# Altium schematic symbol library AD_Lib.SchLib: 1239 symbols (part 6 of 9)
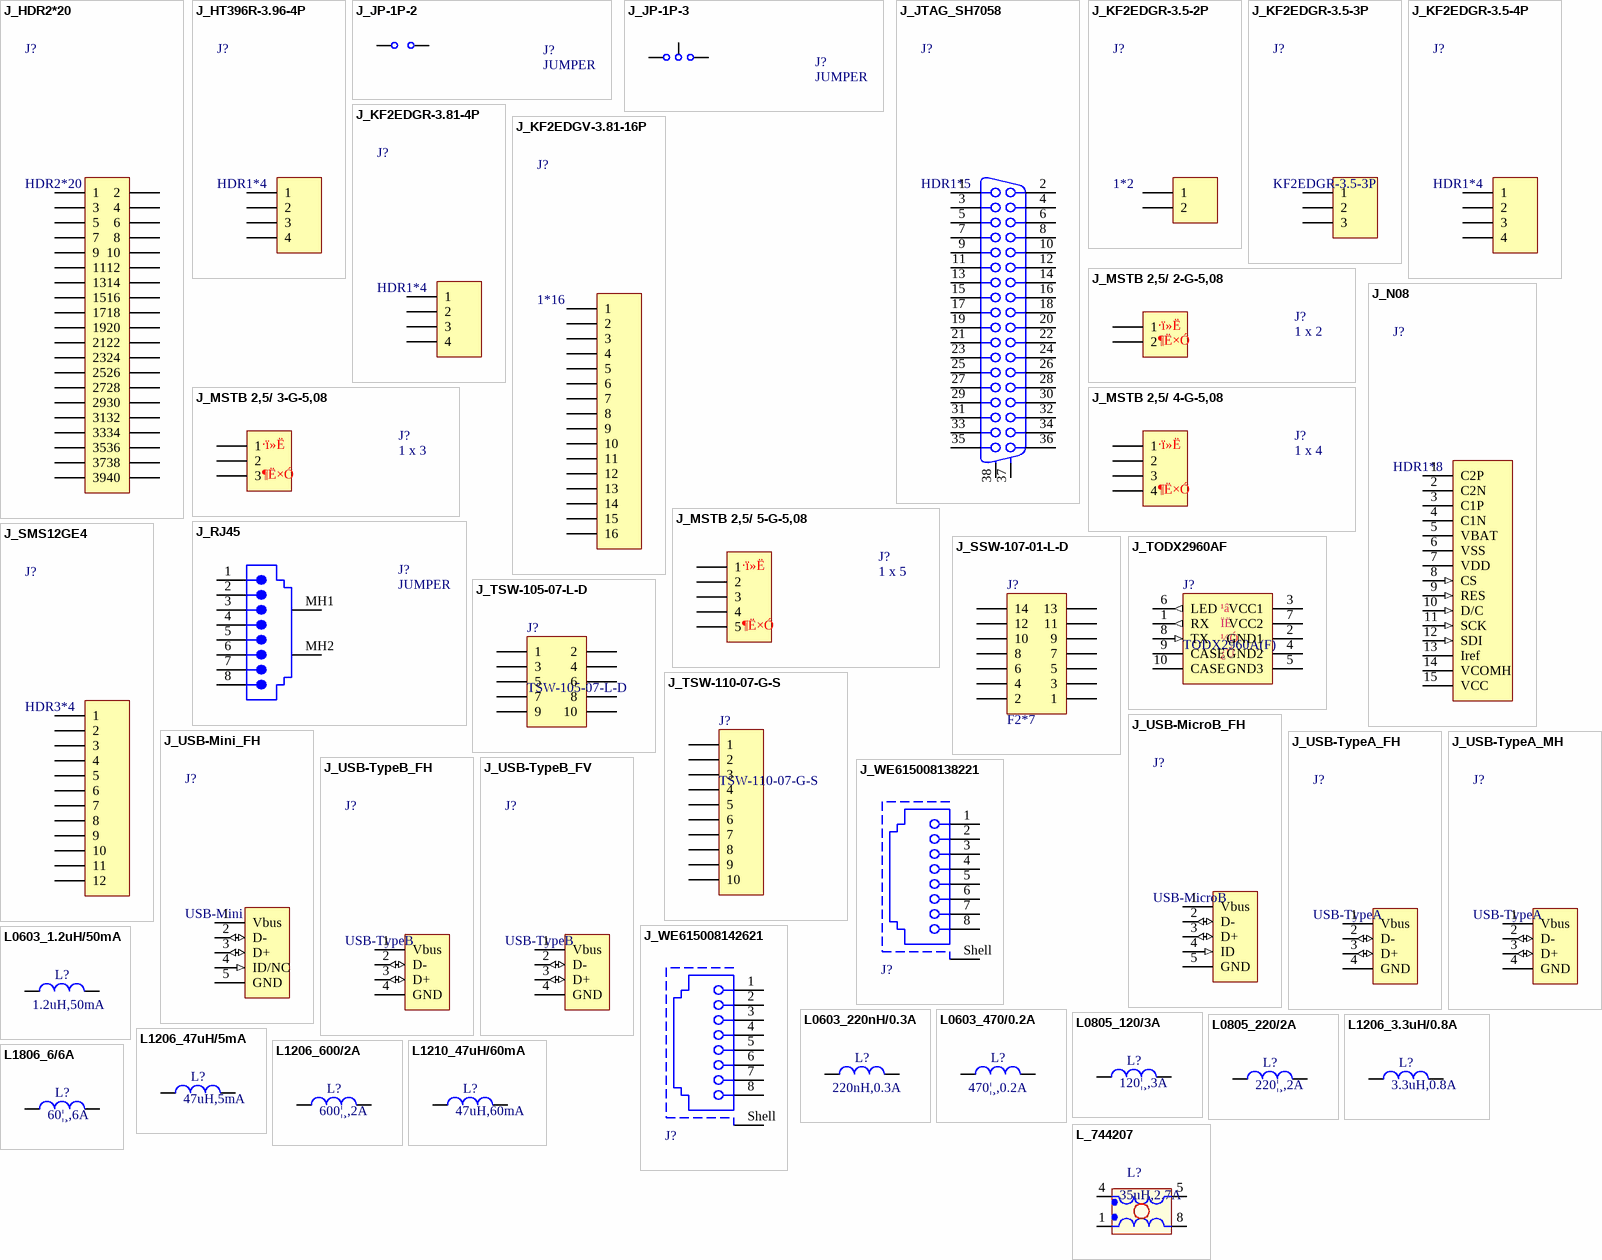
[diagram p47: symbols J_HDR2*20 to L_744207]

## J_USB-TypeB_FH
designator J?, comment USB-TypeB
USB; Type B; Female; Angle; Manufacturer: TE; Quality: -30~80¡ãC; pro-environment: RoHS; Value: USB,Type B, Female; OPN: 292304-1; PadsNum: 0; other: USB; Type B; Female; Angle; SN: SN; Category: Á¬½ÓÆ÷; Part: USB-TypeB; QTY: 100; Price: 1.61; OPN_JLC: 921-111A1010D10200; SN_JLC: C46392; Price_JLC: 0.519005
footprint J_USB-TypeB_FH (Footprint not found)
pins: 1 Vbus (power), 2 D- (io), 3 D+ (io), 4 GND (power)

## J_USB-TypeB_FV
designator J?, comment USB-TypeB
USB; Type B; Female; Vertical; Manufacturer: ¾«ÍØ½ð; Quality: -30~80¡ãC; pro-environment: RoHS; Value: USB,Type B, Female; PadsNum: 0; other: USB; Type B; Female; Vertical; SN: SN; Category: Á¬½ÓÆ÷; OPN: -; Part: USB-TypeB; QTY: 100; Price: -; OPN_JLC: 921-111A1010Y10200; SN_JLC: C26234; Price_JLC: 0.7224
footprint J_USB-TypeB_FV (USB - Type B£¬Ä¸×ù£¬´¹Ö±°²×°£»921-111A1010Y10200£¨C26234£©)
pins: 1 Vbus (power), 2 D- (io), 3 D+ (io), 4 GND (power)

## J_WE615008138221
designator J?, comment 615008138221  (value not drawn)
WR-MJ Modular Jack THT Vertical Shielded 8P8C Front Post; Manufacturer: Wurth Elektronik; Contact Resistance: 20mOhm; Insulation Resistance: 500MOhm; LED: No; Number of Ports: 1; Rated Current: 1.5A; Shielding: Yes; Working Voltage: 120VAC; Withstanding Voltage: 1000VAC; ComponentLink1Description: Manufacturer Link; ComponentLink1URL: https://www.we-online.com/redexpert/article/615008138221?ad; ComponentLink2Description: Datasheet; ComponentLink2URL: https://www.we-online.com/redexpert/spec/615008138221?ad; Category: Input/Output Connectors; Match Code: WR-MJ; Manufacturer Part Number: 615008138221; Mount: Through Hole; Operating Temperature Max: 85°C; Operating Temperature Min: -40°C; Packaging: Tray; Number of Pins: 8P8C; Orientation: Vertical
footprint 615008138221
pins: 1, 2, 3, 4, 5, 6, 7, 8, Shell

## J_WE615008142621
designator J?, comment 615008142621  (value not drawn)
WR-MJ Modular Jack THT Horizontal Shielded Rear Grounding Post 8P8C Tab Down; Manufacturer: Wurth Elektronik; Contact Resistance: 20mOhm; Insulation Resistance: 500MOhm; LED: No; Number of Ports: 1; Rated Current: 1.5A; Shielding: Yes; Working Voltage: 120VAC; Withstanding Voltage: 1000VAC; ComponentLink1Description: Manufacturer Link; ComponentLink1URL: https://www.we-online.com/redexpert/article/615008142621?ad; ComponentLink2Description: Datasheet; ComponentLink2URL: https://www.we-online.com/redexpert/spec/615008142621?ad; Category: Input/Output Connectors; Match Code: WR-MJ; Manufacturer Part Number: 615008142621; Mount: Through Hole; Operating Temperature Max: 85°C; Operating Temperature Min: -40°C; Packaging: Tray; Number of Pins: 8P8C; Orientation: Horizontal
footprint 615008142621
pins: 1, 2, 3, 4, 5, 6, 7, 8, Shell

## L0603_1.2uH/50mA
designator L?, comment 1.2uH,50mA
ÌùÆ¬µç¸Ð; Manufacturer: TDK; Quality: -55~125¡æ; pro-environment: RoHS; OPN: MLF1608A1R2KTA00; PadsNum: 0; SN: SN; Category: µç¸Ð; Part: MLF1608A1R2KTA00; QTY: 4000; Price: 0.46895; OPN_JLC: OPN_JLC; SN_JLC: SN_JLC; Value: 1.2uH,50mA; Price_JLC: 0
footprint L0603 (Footprint not found)
pins: 1, 2

## L0603_220nH/0.3A
designator L?, comment 220nH,0.3A
ÌùÆ¬µç¸Ð; Manufacturer: Johanson Technology Inc.; Quality: -40~100¡æ; pro-environment: RoHS; OPN: L-14CR22JV4T; PadsNum: 0; SN: SN; Category: µç¸Ð; Part: L-14CR22JV4T; QTY: 4000; Price: 0.16965; OPN_JLC: OPN_JLC; SN_JLC: SN_JLC; Value: 220nH,0.3A; Price_JLC: 0
footprint L0603 (Footprint not found)
pins: 1, 2

## L0603_470/0.2A
designator L?, comment value 470¦¸,0.2A  (hidden comment: BLM18RK471SN1D)
ÌùÆ¬´ÅÖé; Manufacturer: Murata; Quality: -55~120¡æ; SN: 03.4.32.30.16047101S; pro-environment: RoHS; PadsNum: 0; Category: µç¸Ð; OPN: BLM18RK471SN1D; Part: BLM18RK471SN1D; QTY: 4000; Price: 0.16965; OPN_JLC: OPN_JLC; SN_JLC: SN_JLC; Price_JLC: 0
footprint L0603 (Footprint not found)
pins: 1, 2

## L0805_120/3A
designator L?, comment 120¦¸,3A
ÌùÆ¬´ÅÖé; Manufacturer: ·ç»ª¸ß¿Æ; Quality: -55~80¡æ; SN: 03.4.32.28.17012101S; pro-environment: RoHS; OPN: CBW201209U121T; PadsNum: 0; Category: µç¸Ð; Part: CBW201209U121T; Value: 120¦¸,3A; Price: ?; OPN_JLC: GZ2012D101TF; SN_JLC: C1015; Price_JLC: 0
footprint L0805 (ÌùÆ¬´ÅÖé)
pins: 1, 2

## L0805_220/2A
designator L?, comment 220¦¸,2A
ÌùÆ¬´ÅÖé; Manufacturer: Murata; Quality: -55~125¡æ; pro-environment: RoHS; OPN: BLM21PG221SN1D; PadsNum: 2; SN: SN; Category: µç¸Ð; Part: BLM21PG221SN1D; Value: 220¦¸,2A; QTY: 4000; Price: 0.18486; OPN_JLC: BLM21PG221SN1D; SN_JLC: C85840; Price_JLC: 0.163828
footprint L0805 (ÌùÆ¬´ÅÖé)
pins: 1, 2

## L1206_3.3uH/0.8A
designator L?, comment 3.3uH,0.8A
ÌùÆ¬µç¸Ð; 3.3uH; 0.8A; 0.3¦¸;; Manufacturer: Murata; Quality: -55~125¡æ; pro-environment: RoHS; OPN: LQM31PN3R3M00L; PadsNum: 2; SN: SN; Category: µç¸Ð; Part: LQM31PN3R3M00L; Value: 3.3uH,0.8A; QTY: 3000; Price: 0.58; OPN_JLC: LQM31PN3R3M00L; SN_JLC: C91612; Price_JLC: 0.58
footprint L1206 (¹«ÖÆ3216£»Ó¢ÖÆ1206£»¹¦ÂÊ1/4W)
pins: 1, 2

## L1206_47uH/5mA
designator L?, comment 47uH,5mA
ÌùÆ¬µç¸Ð; 47uH; 5mA; 3.4¦¸;; Manufacturer: Sunltech; Quality: -55~125¡æ; pro-environment: RoHS; OPN: SCL3216T470KSP; PadsNum: 2; SN: SN; Category: µç¸Ð; Part: SCL3216T470KSP; Value: 47uH,5mA; QTY: 3000; Price: 0.172711; OPN_JLC: CMI321611J470KT; SN_JLC: C75660; Price_JLC: 0.137879
footprint L1206 (¹«ÖÆ3216£»Ó¢ÖÆ1206£»¹¦ÂÊ1/4W)
pins: 1, 2

## L1206_600/2A
designator L?, comment 600¦¸,2A
ÌùÆ¬´ÅÖé; Manufacturer: Wurth; Quality: -55~125¡æ; pro-environment: RoHS; OPN: 74279218; PadsNum: 2; SN: SN; Category: µç¸Ð; Part: 74279218; Value: 600¦¸,2A; QTY: 3000; Price: 1.2519; OPN_JLC: SCBG321609U601T; SN_JLC: C480914; Price_JLC: 0.048322
footprint L1206 (¹«ÖÆ3216£»Ó¢ÖÆ1206£»¹¦ÂÊ1/4W)
pins: 1, 2

## L1210_47uH/60mA
designator L?, comment 47uH,60mA
ÌùÆ¬µç¸Ð; 47uH; 60mA; 7¦¸;; Manufacturer: TDK; Quality: -55~125¡æ; pro-environment: RoHS; OPN: NLV32T-470J-PF; PadsNum: 2; SN: SN; Category: µç¸Ð; Part: NLV32T-470J-PF; Value: 47uH,60mA; QTY: 2000; Price: 0.188443; OPN_JLC: NLV32T-470J-PF; SN_JLC: C66936; Price_JLC: 0.188443
footprint L1210 (Footprint not found)
pins: 1, 2

## L1806_6/6A
designator L?, comment 60¦¸,6A
ÌùÆ¬´ÅÖé; Manufacturer: Murata; Quality: -55~125¡æ; pro-environment: RoHS; OPN: BLM41PG600SN1L; PadsNum: 0; SN: SN; Category: µç¸Ð; Part: BLM41PG600SN1L; Value: 60¦¸,6A; QTY: 2500; Price: 1.03734; OPN_JLC: OPN_JLC; SN_JLC: SN_JLC; Price_JLC: 0
footprint L1806 (Footprint not found)
pins: 1, 2

## L_744207
designator L?, comment 35uH,2.7A
¹²Ä£µç¸Ð; 35uH; 2.7A; Manufacturer: Wurth; Quality: -40~85¡æ; SN: 03.4.32.37.99420701S; pro-environment: RoHS; other: 35uH;2.7A;0.035¦¸; OPN: 744207; PadsNum: 0; Part: 744207; Category: µç¸Ð; Value: 35uH,2.7A; QTY: 1000; Price: ?; OPN_JLC: OPN_JLC; SN_JLC: SN_JLC; Price_JLC: 0
footprint 744207 (Footprint not found)
pins: 1, 4, 5, 8

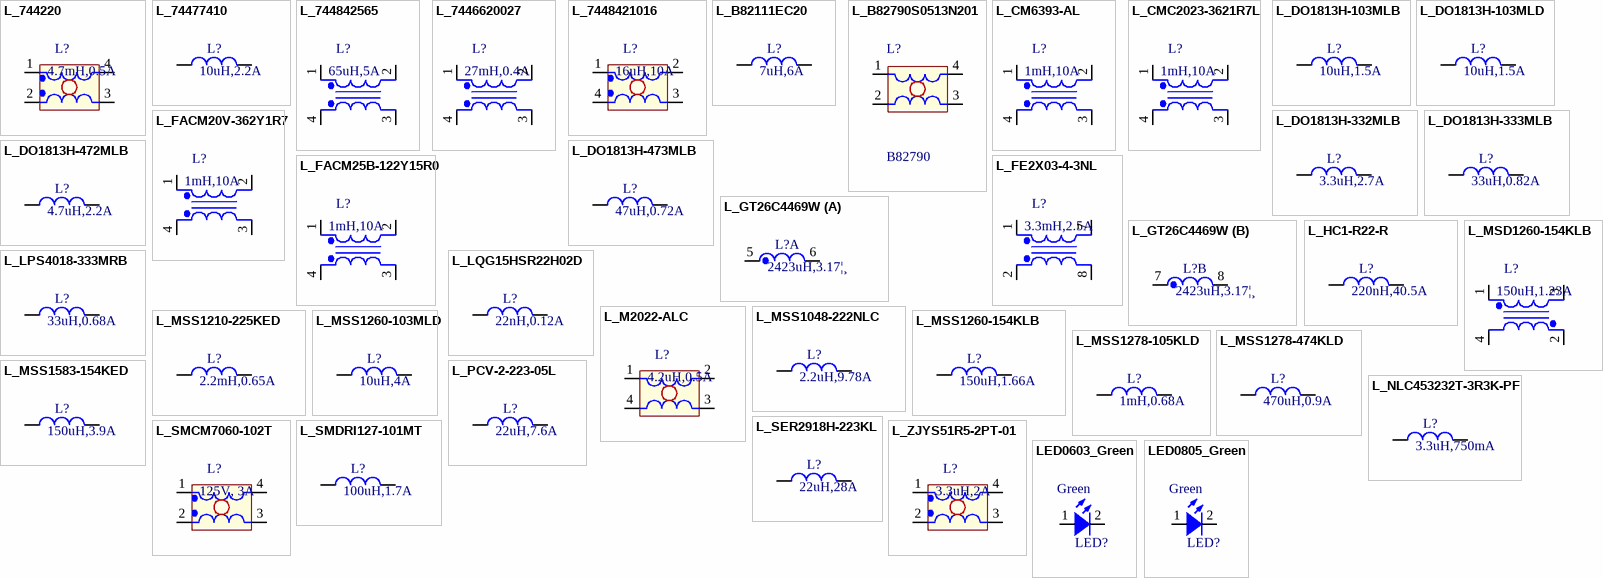
[diagram p25: symbols L_744220 to LED0805_Green]

## L_744220
designator L?, comment 4.7mH,0.5A
¹²Ä£µç¸Ð;4.7mH;0.5A; Manufacturer: Wurth; Quality: -25~125¡æ; SN: 03.4.32.23.99422001S; pro-environment: RoHS; other: 0.5A;0.75¦¸;4.7mH; OPN: 744220; PadsNum: 0; Part: 744220; Category: µç¸Ð; Value: 4.7mH,0.5A; QTY: 1000; Price: 15.0111; OPN_JLC: OPN_JLC; SN_JLC: SN_JLC; Price_JLC: 0
footprint L_744220 (WuthÖ®¹²Ä£µç¸Ð)
pins: 1, 2, 3, 4

## L_74477410
designator L?, comment 10uH,2.2A
µç¸Ð;10uH;2.2A; Manufacturer: Wurth; Quality: -40~85¡æ; SN: 03.4.32.23.99741001S; pro-environment: RoHS; OPN: 74477410; PadsNum: 0; Category: µç¸Ð; Part: 74477410; Value: 10uH,2.2A; QTY: 1500; Price: 10.4247; OPN_JLC: OPN_JLC; SN_JLC: SN_JLC; Price_JLC: 0
footprint WE_PD2 (Footprint not found)
pins: 1, 2

## L_744842565
designator L?, comment 65uH,5A
¹²Ä£µç¸Ð;65uH;5A; Manufacturer: Wurth; Quality: -25~125¡æ; pro-environment: RoHS; other: 5A,13m¦¸; OPN: 744842565; PadsNum: 0; SN: SN; Part: 744842565; Category: µç¸Ð; Value: 65uH,5A; QTY: 80; Price: ?; OPN_JLC: OPN_JLC; SN_JLC: SN_JLC; Price_JLC: 0
footprint L_744842565 (Wurth¹²Ä£µç¸Ð)
pins: 1, 2, 3, 4

## L_7446620027
designator L?, comment 27mH,0.4A
¹²Ä£µç¸Ð;27mH;0.4A; Manufacturer: Wurth; Quality: -25~125¡æ; SN: 03.4.32.23.99744601S; pro-environment: RoHS; other: 0.4A;1.2¦¸;27mH; OPN: 7446620027; PadsNum: 0; Part: 7446620027; Category: µç¸Ð; Value: 27mH,0.4A; QTY: 90; Price: 30.7242; OPN_JLC: OPN_JLC; SN_JLC: SN_JLC; Price_JLC: 0
footprint L_7446620027 (Wurth¹²Ä£µç¸Ð)
pins: 1, 2, 3, 4

## L_7448421016
designator L?, comment 16uH,10A
¹²Ä£µç¸Ð;16uH;10A; Manufacturer: Wurth; Quality: -25~125¡æ; SN: 03.4.32.37.99101601S; pro-environment: RoHS; other: 10A;3m¦¸;16uH; OPN: 7448421016; PadsNum: 0; Part: 7448421016; Category: µç¸Ð; Value: 16uH,10A; QTY: 80; Price: 54.1359; OPN_JLC: OPN_JLC; SN_JLC: SN_JLC; Price_JLC: 0
footprint L_7448421016 (Wurth¹²Ä£µç¸Ð)
pins: 1, 2, 3, 4

## L_B82111EC20
designator L?, comment 7uH,6A
µç¸Ð; Manufacturer: TDK; Part: B82111EC20; Quality: -55~125¡æ; pro-environment: RoHS; OPN: B82111E0000C020; other: 7uH;6A;Rdc=20m¦¸;fr=180 MHz;10%; PadsNum: 0; SN: SN; Category: µç¸Ð; Value: 7uH,6A; QTY: 1000; Price: 4.9608; OPN_JLC: OPN_JLC; SN_JLC: SN_JLC; Price_JLC: 0
footprint L_B82111E (Footprint not found)
pins: 1, 2

## L_B82790S0513N201
designator L?, comment B82790
¹²Ä£µç¸Ð;51uH;0.5A; Manufacturer: EPCOS / TDK; pro-environment: RoHS; Quality: -40~85¡æ; SN: 03.4.32.37.99020101S; Value: 51uH,0.5A; other: 51uH,0.5A,0.14; OPN: B82790S0513N201; PadsNum: 0; Category: µç¸Ð; Part: B82790; QTY: 1500; Price: 11.1618; OPN_JLC: OPN_JLC; SN_JLC: SN_JLC; Price_JLC: 0
footprint L_B82790 (EPCOS¹²Ä£µç¸Ð)
pins: 1, 2, 3, 4

## L_CM6393-AL
designator L?, comment 1mH,10A
¹²Ä£µç¸Ð£¬¶¨ÖÆ; Manufacturer: ¶¨ÖÆ; Quality: -25~85¡æ; pro-environment: RoHS; OPN: CM6393-AL; PadsNum: 0; SN: SN; other: ¶¨ÖÆ; Part: CM6393-AL; Category: µç¸Ð; Value: 1mH,10A; QTY: 1; Price: ?; OPN_JLC: OPN_JLC; SN_JLC: SN_JLC; Price_JLC: 0
footprint L_CM6393-AL (¶¨ÖÆµç¸Ð)
pins: 1, 2, 3, 4

## L_CMC2023-3621R7L
designator L?, comment 1mH,10A
¹²Ä£µç¸Ð£¬¶¨ÖÆ; Manufacturer: ¶¨ÖÆ; Quality: -25~85¡æ; pro-environment: RoHS; OPN: CMC2023-3621R7L; PadsNum: 0; SN: SN; other: ¶¨ÖÆ; Part: CMC2023-3621R7L; Category: µç¸Ð; Value: 1mH,10A; QTY: 1; Price: ?; OPN_JLC: OPN_JLC; SN_JLC: SN_JLC; Price_JLC: 0
footprint L_CMC2023-3621R7L (¶¨ÖÆµç¸Ð)
pins: 1, 2, 3, 4

## L_DO1813H-103MLB
designator L?, comment 10uH,1.5A
µç¸Ð; Manufacturer: Coilcraft; Quality: -40~85¡æ; SN: 03.4.32.23.99010302S; pro-environment: RoHS; OPN: DO1813H-103MLB; PadsNum: 0; Category: µç¸Ð; Part: DO1813H-103MLB; Value: 10uH,1.5A; QTY: 750; Price: ?; OPN_JLC: OPN_JLC; SN_JLC: SN_JLC; Price_JLC: 0
footprint L_DO1813H (CoilcraftÖ®DO1813HÏµÁÐµç¸Ð.£¬ÈçDO1813H-103ML)
pins: 1, 2

## L_DO1813H-103MLD
designator L?, comment 10uH,1.5A
µç¸Ð; Manufacturer: Coilcraft; Quality: -40~85¡æ; pro-environment: RoHS; OPN: DO1813H-103MLD; PadsNum: 0; SN: SN; Category: µç¸Ð; Part: DO1813H-103MLD; Value: 10uH,1.5A; QTY: 1000; Price: 5.8968; OPN_JLC: OPN_JLC; SN_JLC: SN_JLC; Price_JLC: 0
footprint L_DO1813H (CoilcraftÖ®DO1813HÏµÁÐµç¸Ð.£¬ÈçDO1813H-103ML)
pins: 1, 2

## L_DO1813H-332MLB
designator L?, comment 3.3uH,2.7A
µç¸Ð; Manufacturer: Coilcraft; Quality: -40~85¡æ; SN: 03.4.32.23.99033201S; pro-environment: RoHS; OPN: DO1813H-332MLB; PadsNum: 0; Category: µç¸Ð; Part: DO1813H-332MLB; Value: 3.3uH,2.7A; QTY: 30; Price: ?; OPN_JLC: OPN_JLC; SN_JLC: SN_JLC; Price_JLC: 0
footprint L_DO1813H (CoilcraftÖ®DO1813HÏµÁÐµç¸Ð.£¬ÈçDO1813H-103ML)
pins: 1, 2

## L_DO1813H-333MLB
designator L?, comment 33uH,0.82A
µç¸Ð; Manufacturer: Coilcraft; Part: DO1813H-333ML; Quality: -40~85¡æ; pro-environment: RoHS; OPN: DO1813H-333MLB; other: 33uH,0.82A,20MHz,20%; PadsNum: 0; SN: SN; Category: µç¸Ð; Value: 33uH,0.82A; QTY: 1000; Price: ?; OPN_JLC: OPN_JLC; SN_JLC: SN_JLC; Price_JLC: 0
footprint L_DO1813H (CoilcraftÖ®DO1813HÏµÁÐµç¸Ð.£¬ÈçDO1813H-103ML)
pins: 1, 2

## L_DO1813H-472MLB
designator L?, comment 4.7uH,2.2A
µç¸Ð; Manufacturer: Coilcraft; Part: DO1813H-472ML; Quality: -40~85¡æ; SN: 03.4.32.23.99047202S; pro-environment: RoHS; OPN: DO1813H-472MLB; PadsNum: 0; Category: µç¸Ð; Value: 4.7uH,2.2A; QTY: 30; Price: ?; OPN_JLC: OPN_JLC; SN_JLC: SN_JLC; Price_JLC: 0
footprint L_DO1813H (CoilcraftÖ®DO1813HÏµÁÐµç¸Ð.£¬ÈçDO1813H-103ML)
pins: 1, 2

## L_DO1813H-473MLB
designator L?, comment 47uH,0.72A
µç¸Ð; Manufacturer: Coilcraft; Part: DO1813H-473ML; Quality: -40~85¡æ; SN: 03.4.32.23.99047301S; pro-environment: RoHS; OPN: DO1813H-473MLB; PadsNum: 0; Category: µç¸Ð; Value: 47uH,0.72A; QTY: 30; Price: 10.7055; OPN_JLC: OPN_JLC; SN_JLC: SN_JLC; Price_JLC: 0
footprint L_DO1813H (CoilcraftÖ®DO1813HÏµÁÐµç¸Ð.£¬ÈçDO1813H-103ML)
pins: 1, 2

## L_FACM20V-362Y1R7
designator L?, comment 1mH,10A
¹²Ä£µç¸Ð£¬¶¨ÖÆ; Manufacturer: ¶¨ÖÆ; Quality: -25~85¡æ; SN: 03.4.32.37.99M20V01S; pro-environment: RoHS; OPN: FACM20V-362Y1R7; PadsNum: 0; other: ¶¨ÖÆ; Part: FACM20V-362Y1R7; Category: µç¸Ð; Value: 1mH,10A; QTY: 1; Price: ?; OPN_JLC: OPN_JLC; SN_JLC: SN_JLC; Price_JLC: 0
footprint L_FACM20V-362Y1R7 (¶¨ÖÆµç¸Ð)
pins: 1, 2, 3, 4

## L_FACM25B-122Y15R0
designator L?, comment 1mH,10A
¹²Ä£µç¸Ð£¬¶¨ÖÆ; Manufacturer: ¶¨ÖÆ; Quality: -25~85¡æ; SN: 03.4.32.37.99M25B01S; pro-environment: RoHS; OPN: FACM25B-122Y15R0; PadsNum: 0; other: ¶¨ÖÆ; Part: FACM25B-122Y15R0; Category: µç¸Ð; Value: 1mH,10A; QTY: 1; Price: ?; OPN_JLC: OPN_JLC; SN_JLC: SN_JLC; Price_JLC: 0
footprint L_FACM25B-122Y15R0 (¶¨ÖÆµç¸Ð)
pins: 1, 2, 3, 4

## L_FE2X03-4-3NL
designator L?, comment 3.3mH,2.5A
¹²Ä£µç¸Ð;3.3mH;2.5A; Manufacturer: Pulse; Quality: 0~60¡æ; pro-environment: RoHS; other: 3.3mH,2.5A,700m¦¸; OPN: FE2X03-4-3NL; PadsNum: 0; SN: SN; Part: FE2X03-4-3NL; Category: µç¸Ð; Value: 3.3mH,2.5A; QTY: 20; Price: 25.3539; OPN_JLC: OPN_JLC; SN_JLC: SN_JLC; Price_JLC: 0
footprint L_744842565 (Wurth¹²Ä£µç¸Ð)
pins: 1, 2, 7, 8

## L_GT26C4469W
designator L?, comment 2423uH,3.17¦¸
µç¸Ð; Manufacturer: ²©¶à; Quality: -40~85¡æ; pro-environment: RoHS; OPN: GT26C4469W; PadsNum: 0; SN: SN; Category: µç¸Ð; Part: GT26C4469W; Value: 2423uH,3.17¦¸; QTY: 1; Price: ?; OPN_JLC: OPN_JLC; SN_JLC: SN_JLC; Price_JLC: 0
footprint L_GT26C4469W (¶¨ÖÆµç¸Ð)
part A pins: 5, 6
part B pins: 7, 8

## L_HC1-R22-R
designator L?, comment 220nH,40.5A
µç¸Ð;220nH;40.5A;360m¦¸; Manufacturer: Eaton; Quality: -40~105¡æ; pro-environment: RoHS; OPN: HC1-R22-R; other: 220nH,40.5A,360m¦¸; PadsNum: 0; SN: SN; Category: µç¸Ð; Part: HC1-R22-R; Value: 220nH,40.5A; QTY: 250; Price: 19.0359; OPN_JLC: OPN_JLC; SN_JLC: SN_JLC; Price_JLC: 0
footprint L_HC1 (Footprint not found)
pins: 1, 2

## L_LPS4018-333MRB
designator L?, comment 33uH,0.68A
ÌùÆ¬µç¸Ð; 33uH; 0.68A; 0.42¦¸;; Manufacturer: Coilcraft; Quality: -55~125¡æ; pro-environment: RoHS; OPN: LPS4018-333MRB; PadsNum: 2; SN: SN; Category: µç¸Ð; Part: LPS4018-333MRB; Value: 33uH,0.68A; QTY: 3000; Price: 4.2488; OPN_JLC: ASPI-0315S-330M-T; SN_JLC: C187268; Price_JLC: 2.13
footprint L_LPS4018 (CoilcraftÖ®LPS4018ÏµÁÐµç¸Ð.£¬ÈçLPS4018-333MRB)
pins: 1, 2

## L_LQG15HSR22H02D
designator L?, comment 22nH,0.12A
µç¸Ð; 22nH; 0.12A; 3.77¦¸; Manufacturer: Murata; Quality: -40~85¡æ; pro-environment: RoHS; OPN: LQG15HSR22H02D; PadsNum: 0; SN: SN; Category: µç¸Ð; Part: LQG15HSR22H02D; Value: 22nH,0.12A; QTY: 10000; Price: 0.18369; OPN_JLC: OPN_JLC; SN_JLC: SN_JLC; Price_JLC: 0
footprint L0402 (Footprint not found)
pins: 1, 2

## L_M2022-ALC
designator L?, comment 4.2uH,0.5A
¹²Ä£µç¸Ð;4.2uH,0.5A; Manufacturer: Coilcraft; Part: M2022; Quality: -25~125¡æ; SN: 03.4.32.37.99202201S; pro-environment: RoHS; other: 4.2uH,0.5A,800m¦¸; OPN: M2022-ALC; PadsNum: 0; Category: µç¸Ð; Value: 4.2uH,0.5A; QTY: 600; Price: 9.3132; OPN_JLC: OPN_JLC; SN_JLC: SN_JLC; Price_JLC: 0
footprint L_M2022 (Footprint not found)
pins: 1, 2, 3, 4

## L_MSD1260-154KLB
designator L?, comment 150uH,1.23A
ñîºÏµç¸Ð; 150uH; 1.23A; 476m¦¸; Manufacturer: Coilcraft; Part: MSD1260-154; Quality: -40~85¡æ; SN: 03.4.32.23.99015401S; pro-environment: RoHS; other: 1.23A,476m¦¸; OPN: MSD1260-154KLB; PadsNum: 0; Category: µç¸Ð; Value: 150uH,1.23A; QTY: 1; Price: 16.9299; OPN_JLC: OPN_JLC; SN_JLC: SN_JLC; Price_JLC: 0
footprint L_MSD1260 (CoilcraftÖ®MSD1260ÏµÁÐñîºÏµç¸Ð)
pins: 1, 2, 3, 4

## L_MSS1048-222NLC
designator L?, comment 2.2uH,9.78A
µç¸Ð; 2.2uH; 9.78A; 7.2 ¦¸; Manufacturer: Coilcraft; Part: MSS1048-222; Quality: -40~85¡æ; SN: 03.4.32.23.99022201S; pro-environment: RoHS; OPN: MSS1048-222NLC; other: 2.2uH,9.78A,7.2 ¦¸; PadsNum: 0; Category: µç¸Ð; Value: 2.2uH,9.78A; QTY: 200; Price: 8.7282; OPN_JLC: OPN_JLC; SN_JLC: SN_JLC; Price_JLC: 0
footprint L_MSS1048 (Footprint not found)
pins: 1, 2

## L_MSS1210-225KED
designator L?, comment 2.2mH,0.65A
µç¸Ð; 2.2mH; 0.65A; 2.2 ¦¸; Manufacturer: Coilcraft; Part: MSS1210-225; Quality: -40~85¡æ; SN: 03.4.32.28.19225K01S; pro-environment: RoHS; OPN: MSS1210-225KED; PadsNum: 0; Category: µç¸Ð; Value: 2.2mH,0.65A; QTY: 300; Price: 11.1618; OPN_JLC: OPN_JLC; SN_JLC: SN_JLC; Price_JLC: 0
footprint L_MSS1210 (CoilcraftÖ®MSS1210ÏµÁÐ£¬MSS1210-225KED)
pins: 1, 2

## L_MSS1260-103MLD
designator L?, comment 10uH,4A
µç¸Ð; 10uH; 4A; 23.9m¦¸; Manufacturer: Coilcraft; Part: MSS1260-103; Quality: -40~85¡æ; SN: 03.4.32.23.99010305S; pro-environment: RoHS; other: 4A,23.9m¦¸,10uH,20%; OPN: MSS1260-103MLD; PadsNum: 0; Category: µç¸Ð; Value: 10uH,4A; QTY: 500; Price: 8.9271; OPN_JLC: OPN_JLC; SN_JLC: SN_JLC; Price_JLC: 0
footprint L_MSD1260 (CoilcraftÖ®MSD1260ÏµÁÐñîºÏµç¸Ð)
pins: 1, 2

## L_MSS1260-154KLB
designator L?, comment 150uH,1.66A
µç¸Ð; 10uH; 4A; 23.9m¦¸; Manufacturer: Coilcraft; Part: MSS1260-154; Quality: -40~85¡æ; pro-environment: RoHS; other: 150uH,1.66A,216m¦¸,10%; OPN: MSS1260-154KLB; PadsNum: 0; SN: SN; Category: µç¸Ð; Value: 150uH,1.66A; QTY: 1; Price: 15.8535; OPN_JLC: OPN_JLC; SN_JLC: SN_JLC; Price_JLC: 0
footprint L_MSD1260 (CoilcraftÖ®MSD1260ÏµÁÐñîºÏµç¸Ð)
pins: 1, 2

## L_MSS1278-105KLD
designator L?, comment 1mH,0.68A
µç¸Ð; 1mH; 0.68A; 1.483¦¸; Manufacturer: Coilcraft; Part: MSS1278-105; Quality: -40~85¡æ; SN: 03.4.32.28.99105K01S; pro-environment: RoHS; OPN: MSS1278-105KLD; PadsNum: 0; Category: µç¸Ð; Value: 1mH,0.68A; QTY: 500; Price: 9.009; OPN_JLC: OPN_JLC; SN_JLC: SN_JLC; Price_JLC: 0
footprint L_MSS1278 (CoilcraftÖ®MSS1278ÏµÁÐ£¬MSS1278-103ML)
pins: 1, 2

## L_MSS1278-474KLD
designator L?, comment 470uH,0.9A
µç¸Ð; 470uH; 0.9A; 786.2m¦¸; Manufacturer: Coilcraft; Part: MSS1278-474; Quality: -40~85¡æ; SN: 03.4.32.28.19474K01S; pro-environment: RoHS; OPN: MSS1278-474KLD; PadsNum: 0; Category: µç¸Ð; Value: 470uH,0.9A; QTY: 500; Price: 9.009; OPN_JLC: OPN_JLC; SN_JLC: SN_JLC; Price_JLC: 0
footprint L_MSS1278 (CoilcraftÖ®MSS1278ÏµÁÐ£¬MSS1278-103ML)
pins: 1, 2

## L_MSS1583-154KED
designator L?, comment 150uH,3.9A
µç¸Ð; 150uH; 3.9A; 159m¦¸; Manufacturer: Coilcraft; Part: MSS1583-154; Quality: -40~85¡æ; pro-environment: RoHS; OPN: MSS1583-154KED; PadsNum: 0; SN: SN; Category: µç¸Ð; Value: 150uH,3.9A; QTY: 300; Price: 10.9629; OPN_JLC: OPN_JLC; SN_JLC: SN_JLC; Price_JLC: 0
footprint L_MSS1583 (Footprint not found)
pins: 1, 2

## L_NLC453232T-3R3K-PF
designator L?, comment 3.3uH,750mA
µç¸Ð; Manufacturer: TDK; Quality: -40~105¡æ; SN: 03.4.32.23.9903R301S; pro-environment: RoHS; OPN: NLC453232T-3R3K-PF; other: 3.3uH,750mA;Rdc=220m¦¸;fr=45MHz;10%; PadsNum: 0; Category: µç¸Ð; Part: NLC453232T-3R3K-PF; Value: 3.3uH,750mA; QTY: 500; OPN_JLC: OPN_JLC; SN_JLC: SN_JLC; Price_JLC: 0
footprint L1812 (¹«ÖÆ4832£»Ó¢ÖÆ1812£»¹¦ÂÊ1/2W)
pins: 1, 2

## L_PCV-2-223-05L
designator L?, comment 22uH,7.6A
µç¸Ð,22uH,7.6A,20m¦¸; Manufacturer: Coilcraft; Part: PCV-2-223; Quality: -40~85¡æ; SN: 03.4.32.23.99222301S; pro-environment: RoHS; OPN: PCV-2-223-05L; PadsNum: 0; Category: µç¸Ð; Value: 22uH,7.6A; QTY: 49; Price: 35.3691; OPN_JLC: OPN_JLC; SN_JLC: SN_JLC; Price_JLC: 0
footprint L_MSS1210 (CoilcraftÖ®MSS1210ÏµÁÐ£¬MSS1210-225KED)
pins: 1, 2

## L_SER2918H-223KL
designator L?, comment 22uH,28A
µç¸Ð; 22uH; 28A; 2.86m ¦¸; Manufacturer: Coilcraft; Part: SER2918H-223; Quality: -40~85¡æ; SN: 03.4.32.23.99291801S; pro-environment: RoHS; OPN: SER2918H-223KL; other: 22uH,28A,2.86m¦¸,10%; PadsNum: 0; Category: µç¸Ð; Value: 22uH,28A; QTY: 25; Price: 44.2143; OPN_JLC: OPN_JLC; SN_JLC: SN_JLC; Price_JLC: 0
footprint L_SER2918H (CoilcraftÖ®SER2900ÏµÁÐ¹¦ÂÊµç¸Ð)
pins: 1, 2

## L_SMCM7060-102T
designator L?, comment 125V, 3A
¹²Ä£µç¸Ð; 125VDC; 3A; 1.02k¦¸@100MHz; Manufacturer: Ë³ÏèÅµ; Quality: -40~125¡æ; pro-environment: RoHS; other: 3A,17m¦¸; OPN: SMCM7060-102T; PadsNum: 4; SN: SN; Part: SMCM7060-102T; Category: µç¸Ð; Value: 125V, 3A; QTY: 1500; Price: ?; OPN_JLC: SMCM7060-102T; SN_JLC: C381614; Price_JLC: 3.07
footprint L_SMCM7060 (Ë³ÏèÅµÖ®7060ÏµÁÐ¹²Ä£µç¸Ð)
pins: 1, 2, 3, 4

## L_SMDRI127-101MT
designator L?, comment 100uH,1.7A
µç¸Ð; 470uH; 1.7A; 220m¦¸; Manufacturer: SXN(Ë³ÏèÅµ); Part: SMDRI127-101; Quality: -40~85¡æ; pro-environment: RoHS; OPN: SMDRI127-101MT; PadsNum: 2; SN: SN; Category: µç¸Ð; Value: 100uH,1.7A; QTY: 500; Price: ?; OPN_JLC: SMDRI127-101MT; SN_JLC: C10150; Price_JLC: 0.7936
footprint L_SMDRI127 (SXN(Ë³ÏèÅµ)Ö®SMDRI127ÏµÁÐ£¬SMDRI127-101MT)
pins: 1, 2

## L_ZJYS51R5-2PT-01
designator L?, comment 3.3uH,2A
¹²Ä£µç¸Ð;3.3uH;2A; Manufacturer: TDK; Quality: -25~85¡æ; SN: 03.4.32.37.9951R501S; pro-environment: RoHS; other: 2A,60m¦¸; OPN: ZJYS51R5-2PT-01; PadsNum: 0; Part: ZJYS51R5-2PT-01; Category: µç¸Ð; Value: 3.3uH,2A; QTY: 1500; Price: ?; OPN_JLC: OPN_JLC; SN_JLC: SN_JLC; Price_JLC: 0
footprint ZJYS51R5-2 (ZJYS51?ÏµÁÐ¹²Ä£µç¸Ð£¬TDK)
pins: 1, 2, 3, 4

## LED0603_Green
designator LED?, comment Green
·¢¹â¶þ¼«¹Ü; Manufacturer: EVERLIGHT; Quality: -40~150¡æ; pro-environment: RoHS; other: Green,2.2V,20mA; OPN: 19-217/GHC-YR1S2/3T; PadsNum: 2; SN: SN; Value: Green; Category: ·¢¹â¶þ¼«¹Ü; Part: Green; QTY: 3000; Price: 0.119402; OPN_JLC: 19-217/GHC-YR1S2/3T; SN_JLC: C72043; Price_JLC: 0.119402
footprint D0603 (LED)
pins: 1, 2

## LED0805_Green
designator LED?, comment Green
·¢¹â¶þ¼«¹Ü; Manufacturer: Broadcom; Quality: -40~150¡æ; pro-environment: RoHS; SN: 03.4.21.22.17C17001S; other: Green,2.2V,20mA; OPN: HSMG-C170; PadsNum: 0; Value: Green; Category: ·¢¹â¶þ¼«¹Ü; Part: Green; QTY: 4000; Price: 0.61425; OPN_JLC: OPN_JLC; SN_JLC: SN_JLC; Price_JLC: 0
footprint D0805 (ÌùÆ¬LED)
pins: 1, 2

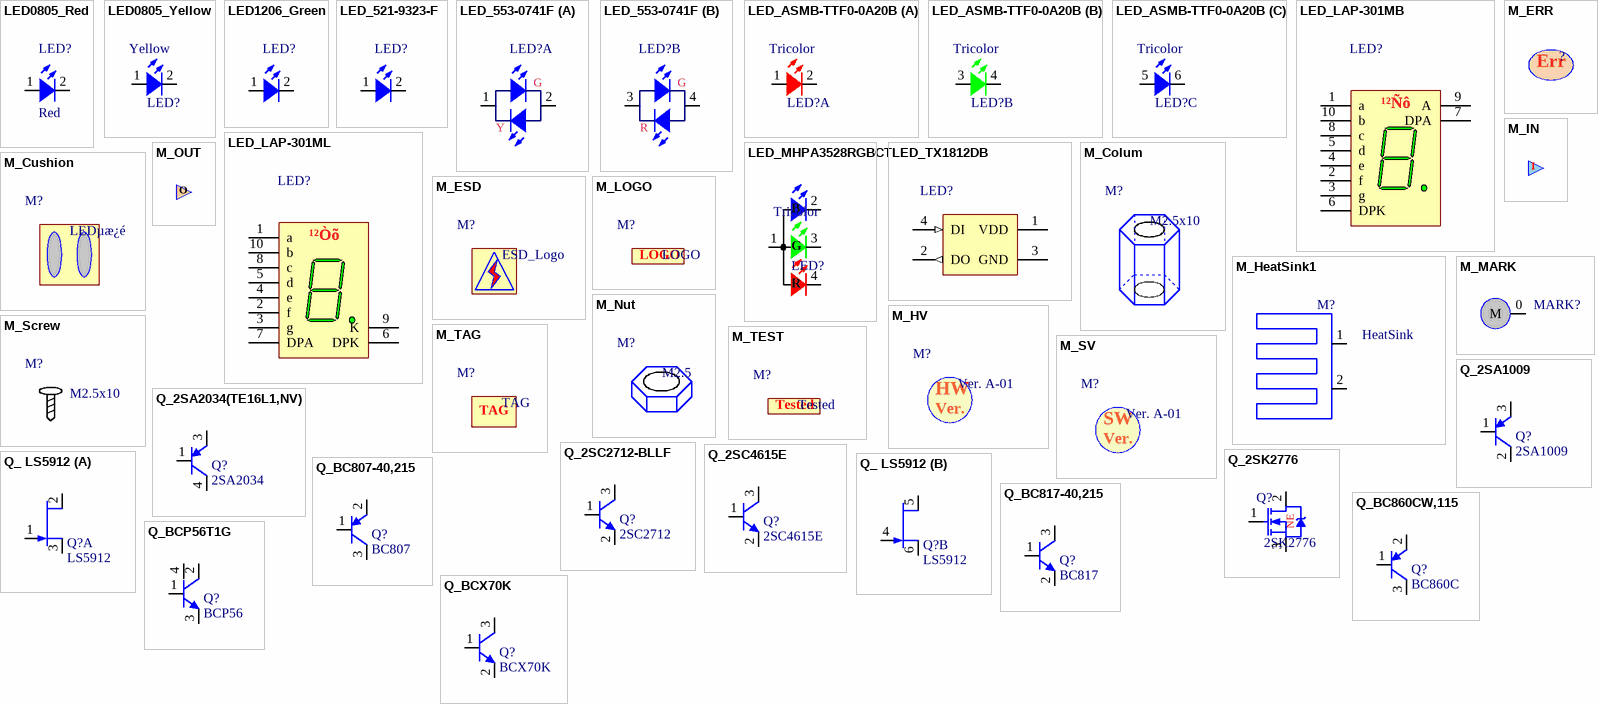
[diagram p26: symbols LED0805_Red to Q_BCX70K]

## LED0805_Red
designator LED?, comment Red
·¢¹â¶þ¼«¹Ü; Manufacturer: PARA; Quality: -40~150¡æ; pro-environment: RoHS; SN: 03.4.21.22.17215101S; other: Red,2.1V,10mA; OPN: L-151LRW-TR; PadsNum: 0; Value: Red; Category: ·¢¹â¶þ¼«¹Ü; Part: Red; QTY: 4000; Price: ?; OPN_JLC: OPN_JLC; SN_JLC: SN_JLC; Price_JLC: 0
footprint D0805 (ÌùÆ¬LED)
pins: 1, 2

## LED0805_Yellow
designator LED?, comment Yellow
·¢¹â¶þ¼«¹Ü; Manufacturer: Broadcom; Quality: -40~150¡æ; pro-environment: RoHS; other: Yellow,2.2V,20mA; OPN: HSMY-C170; PadsNum: 0; SN: SN; Value: Yellow; Category: ·¢¹â¶þ¼«¹Ü; Part: Yellow; QTY: 4000; Price: 0.61425; OPN_JLC: OPN_JLC; SN_JLC: SN_JLC; Price_JLC: 0
footprint D0805 (ÌùÆ¬LED)
pins: 1, 2

## LED1206_Green
designator LED?, comment Green  (value not drawn)
·¢¹â¶þ¼«¹Ü; Manufacturer: Dialight; Quality: -55~80¡æ; pro-environment: RoHS; SN: 03.4.21.22.18330201S; other: Green,2.1V,10mA; OPN: 597-3302-607F; PadsNum: 0; Value: Green; Category: ·¢¹â¶þ¼«¹Ü; Part: Green; QTY: 3000; Price: ?; OPN_JLC: OPN_JLC; SN_JLC: SN_JLC; Price_JLC: 0
footprint D1206 (¹«ÖÆ3216£»Ó¢ÖÆ1206£»¹¦ÂÊ1/4W)
pins: 1, 2

## LED_521-9323-F
designator LED?, comment Green  (value not drawn)
·¢¹â¶þ¼«¹Ü,Green,TH; Manufacturer: Dialight; Quality: -40~85¡æ; pro-environment: RoHS; SN: 03.4.21.22.11932301S; OPN: 521-9323-F; PadsNum: 0; Value: Green; Category: ·¢¹â¶þ¼«¹Ü; Part: Green; QTY: 500; Price: 5.2767; OPN_JLC: OPN_JLC; SN_JLC: SN_JLC; Price_JLC: 0
footprint LED_TH100 (Ö±²åLED£¬Òý½Å¼ä¾à=2.54mm)
pins: 1, 2

## LED_553-0741F
designator LED?, comment Y/G + R/G  (value not drawn)
·¢¹â¶þ¼«¹Ü,Green,TH; Manufacturer: Dialight; Quality: -55~100¡æ; pro-environment: RoHS; Value: 2V/10mA; OPN: 553-0741F; PadsNum: 0; SN: SN; Category: ·¢¹â¶þ¼«¹Ü; Part: Y/G + R/G; QTY: 50; Price: 15.6078; OPN_JLC: OPN_JLC; SN_JLC: SN_JLC; Price_JLC: 0
footprint 553-0741F (Footprint not found)
part A pins: 1, 2
part B pins: 3, 4
part A text: G; Y
part B text: G; R

## LED_ASMB-TTF0-0A20B
designator LED?, comment Tricolor
·¢¹â¶þ¼«¹Ü; ÈýÉ«; Manufacturer: Broadcom; Quality: -40~150¡æ; pro-environment: RoHS; other: Tricolor,2.9V,20mA; OPN: ASMB-TTF0-0A20B; PadsNum: 0; SN: SN; Value: Tricolor; Category: ·¢¹â¶þ¼«¹Ü; Part: Tricolor; QTY: 3000; Price: 0.88366; OPN_JLC: OPN_JLC; SN_JLC: SN_JLC; Price_JLC: 0
footprint PLCC-6 (Footprint not found)
part A pins: 1, 2
part B pins: 3, 4
part C pins: 5, 6

## LED_LAP-301MB
designator LED?, comment LAP-301MB  (value not drawn)
ÊýÂë¹Ü; 7Seg; Green; CA; Manufacturer: Dialight; Quality: -25~75¡æ; pro-environment: RoHS; PadsNum: 0; SN: SN; Value: Green; Category: ·¢¹â¶þ¼«¹Ü; OPN: LAP-301MB; Part: LAP-301MB; QTY: 500; Price: 5.2767; OPN_JLC: OPN_JLC; SN_JLC: SN_JLC; Price_JLC: 0
footprint SEGLED_LAP-301MB (ROHMÖ®LAP-301MBÏµÁÐLEDÊýÂë¹Ü£¬7¶Î)
pins: 1 a "Cathode", 2 f "Cathode", 3 g "Cathode", 4 e "Cathode", 5 d "Cathode", 6 DPK "Anode", 7 DPA "Cathode", 8 c "Cathode", 9 A "Anode", 10 b "Cathode"
text: ¹²Ñô

## LED_LAP-301ML
designator LED?, comment LAP-301ML  (value not drawn)
ÊýÂë¹Ü; 7Seg; Green; CC; Manufacturer: Dialight; Quality: -25~75¡æ; pro-environment: RoHS; PadsNum: 0; SN: SN; Value: Green; Category: ·¢¹â¶þ¼«¹Ü; OPN: LAP-301ML; Part: LAP-301ML; QTY: 500; Price: 5.2767; OPN_JLC: OPN_JLC; SN_JLC: SN_JLC; Price_JLC: 0
footprint SEGLED_LAP301 (ROHMÖ®LAP-301MBÏµÁÐLEDÊýÂë¹Ü£¬7¶Î)
pins: 1 a "Cathode", 2 f "Cathode", 3 g "Cathode", 4 e "Cathode", 5 d "Cathode", 6 DPK "Anode", 7 DPA "Cathode", 8 c "Cathode", 9 K "Anode", 10 b "Cathode"
text: ¹²Òõ

## LED_MHPA3528RGBCT
designator LED?, comment Tricolor
·¢¹â¶þ¼«¹Ü; ÈýÉ«; ¹²Ñô; Manufacturer: MEIHUA(ÃÀ»ª¿Æ¼¼); Quality: -40~150¡æ; pro-environment: RoHS; other: Tricolor,2.7V,20mA; OPN: MHPA3528RGBCT; PadsNum: 4; SN: SN; Value: Tricolor; Category: ·¢¹â¶þ¼«¹Ü; Part: Tricolor; QTY: 2000; Price: 0.5375; OPN_JLC: MHPA3528RGBCT; SN_JLC: C409779; Price_JLC: 0.5788
footprint LED_3528-2 (3528LEDµÆÖé£¬ÈçTX1812DB)
pins: 1, 2, 3, 4
text: B; G; R

## LED_TX1812DB
designator LED?, comment TX1812DB  (value not drawn)
RGBµÆÖé; 4.5~5.5V; 0.8MHz; Manufacturer: ÉîÛÚÌì³É; Quality: -40~85¡æ; Value: 5V,12mA; OPN: TC3528RGB-3CSA; Pro-environment: RoHS; PadsNum: 4; SN: SN; Category: LED; Other: 5V,12mA; Part: TX1812DB; QTY: 2000; Price: 0.278958; OPN_JLC: TC3528RGB-3CSA; SN_JLC: C784553; Price_JLC: 0.260598
footprint LED_3528-1 (3528LEDµÆÖé£¬ÈçTX1812DB)
pins: 1 VDD (power), 2 DO (out), 3 GND (power), 4 DI (in)

## M_Colum
designator M?, comment M2.5x10
Í­Öù; Manufacturer: NJHT; PadsNum: 0; pro-environment: -; SN: -; OPN: -; Part: -; Category: ÔÓÏî; Quality: -; Value: M2.5x10; Price: 0; OPN_JLC: OPN_JLC; SN_JLC: SN_JLC; Price_JLC: 0

## M_Cushion
designator M?, comment LEDµæ¿é
Manufacturer: NJHT; PadsNum: 0; pro-environment: -; SN: -; Part: -; Category: ÔÓÏî; Quality: -; Value: LEDµæ¿é; Price: ?; OPN_JLC: OPN_JLC; SN_JLC: SN_JLC; Price_JLC: 0

## M_ERR
designator M?, comment ?
´íÎó±êÊ¶; Manufacturer: NJHT; OPN: SUM; PadsNum: 0; pro-environment: -; SN: -; Part: -; Category: ÔÓÏî; Quality: -; Value: ?; Price: 0; OPN_JLC: OPN_JLC; SN_JLC: SN_JLC; Price_JLC: 0
text: Err

## M_ESD
designator M?, comment ESD_Logo
¾²µç±êÊ¶; PadsNum: 0; pro-environment: -; SN: -; OPN: -; Part: -; Category: ÔÓÏî; Manufacturer: -; Quality: -; Value: ESD_Logo; QTY: -; Price: 0; OPN_JLC: -; SN_JLC: -; Price_JLC: 0
footprint M_ESD (Footprint not found)

## M_HeatSink1
designator M?, comment HeatSink
É¢ÈÈÆ¬; Manufacturer: NJHT; PadsNum: 0; pro-environment: -; SN: -; Part: -; Category: ÔÓÏî; Quality: -; Value: HeatSink; Price: ?; OPN_JLC: OPN_JLC; SN_JLC: SN_JLC; Price_JLC: 0
pins: 1, 2

## M_HV
designator M?, comment Ver. A-01
Ó²¼þ°æ±¾; PadsNum: 0; pro-environment: -; SN: -; OPN: -; Part: -; Category: ÔÓÏî; Manufacturer: -; Quality: -; Value: Ver. A-01; QTY: -; Price: 0; OPN_JLC: -; SN_JLC: -; Price_JLC: 0
footprint M_HV (PCBÉè¼ÆÐÅÏ¢)
text: HW; Ver.

## M_IN
designator M?, comment Input  (value not drawn)
ÊäÈë¶Ë¿Ú; Manufacturer: NJHT; OPN: SUM; PadsNum: 0; pro-environment: -; SN: -; Part: -; Category: ÔÓÏî; Quality: -; Value: Input; Price: 0; OPN_JLC: OPN_JLC; SN_JLC: SN_JLC; Price_JLC: 0
text: I

## M_LOGO
designator M?, comment LOGO
PadsNum: 0; pro-environment: -; SN: -; OPN: -; Part: -; Category: ÔÓÏî; Manufacturer: -; Quality: -; Value: LOGO; QTY: -; Price: 0; OPN_JLC: -; SN_JLC: -; Price_JLC: 0
footprint M_LOGO_MERAK (MerakÐÂlogo)

## M_MARK
designator MARK?  (value not drawn)
MARK; Manufacturer: NJHT; PadsNum: 0; pro-environment: -; Quality: -; SN: -; OPN: -; Part: -; Category: ¶¨Î»±êÊ¶; Value: -; Price: 0; OPN_JLC: OPN_JLC; SN_JLC: SN_JLC; Price_JLC: 0
footprint M_MARK (Footprint not found)
pins: 0 M

## M_Nut
designator M?, comment M2.5
ÂÝÄ¸; Manufacturer: NJHT; PadsNum: 0; pro-environment: -; SN: -; Part: -; Category: ÔÓÏî; Quality: -; Value: M2.5; Price: ?; OPN_JLC: OPN_JLC; SN_JLC: SN_JLC; Price_JLC: 0

## M_OUT
designator M?, comment Output  (value not drawn)
Êä³ö¶Ë¿Ú; Manufacturer: NJHT; OPN: SUM; PadsNum: 0; pro-environment: -; SN: -; Part: -; Category: ÔÓÏî; Quality: -; Value: Output; Price: 0; OPN_JLC: OPN_JLC; SN_JLC: SN_JLC; Price_JLC: 0
text: O

## M_Screw
designator M?, comment M2.5x10
ÂÝË¿; Manufacturer: NJHT; PadsNum: 0; pro-environment: -; SN: -; Part: -; Category: ÔÓÏî; Quality: -; Value: M2.5x10; Price: 0; OPN_JLC: OPN_JLC; SN_JLC: SN_JLC; Price_JLC: 0

## M_SV
designator M?, comment Ver. A-01
Èí¼þ°æ±¾; Manufacturer: NJHT; OPN: SUM; PadsNum: 0; pro-environment: -; SN: -; Part: -; Category: ÔÓÏî; Quality: -; Value: Ver. A-01; Price: 0; OPN_JLC: OPN_JLC; SN_JLC: SN_JLC; Price_JLC: 0
text: SW; Ver.

## M_TAG
designator M?, comment TAG
ÌùÖ½; 1000mil * 275mil;; Manufacturer: NJHT; PadsNum: 0; pro-environment: -; SN: -; OPN: -; Part: -; Category: ÔÓÏî; Quality: -; Value: TAG; Price: 0; OPN_JLC: OPN_JLC; SN_JLC: SN_JLC; Price_JLC: 0
footprint M_TAG (ESD±êÊ¶£¬ÎÞµçÆøÒâÒå)

## M_TEST
designator M?, comment Tested
²âÊÔ±êÊ¶; PadsNum: 0; pro-environment: -; SN: -; OPN: -; Part: -; Category: ÔÓÏî; Manufacturer: -; Quality: -; Value: Tested; QTY: -; Price: 0; OPN_JLC: -; SN_JLC: -; Price_JLC: 0
footprint M_TESTED (ESD±êÊ¶£¬ÎÞµçÆøÒâÒå)

## Q_2SA1009
designator Q?, comment 2SA1009
Èý¼«¹Ü,PNP,2A,350V; Manufacturer: SANYO; pro-environment: RoHS; Quality: -55~150¡æ; SN: 03.4.22.11.313ACX01S; PadsNum: 0; Value: PNP,2A,350V; OPN: 2SA1009; Part: 2SA1009; Category: Èý¼«¹Ü; QTY: 3000; Price: ?; OPN_JLC: OPN_JLC; SN_JLC: SN_JLC; Price_JLC: 0
footprint TO220-3 (TO, Thru-Hole, Vertical, Heatsink Mounted; 3 In-Line Leads; Pitch 2.54 mm)
pins: 1 B, 2 C, 3 E

## Q_2SA2034(TE16L1,NV)
designator Q?, comment 2SA2034
Èý¼«¹Ü,PNP,2A,400V; Manufacturer: Toshiba; pro-environment: RoHS; Quality: -55~150¡æ; SN: 03.4.22.11.38203401S; OPN: 2SA2034(TE16L1,NV); other: Mark=A2034; PadsNum: 0; Value: PNP,2A,400V; Part: 2SA2034; Category: Èý¼«¹Ü; QTY: ?; Price: ?; OPN_JLC: OPN_JLC; SN_JLC: SN_JLC; Price_JLC: 0
footprint TO252-3 (D-PAK, 4-Leads, Body 6.1x6.5mm, Pitch 2.28mm, Lead Span 9.8mm, IPC Low Density)
pins: 1 B, 3 E, 4 C

## Q_2SC2712-BLLF
designator Q?, comment 2SC2712
Èý¼«¹Ü,NPN,0.15A,50V; Manufacturer: TOSHIBA; pro-environment: RoHS; Quality: -55~125¡æ; SN: 03.4.22.11.48271201S; OPN: 2SC2712-BLLF; PadsNum: 0; Value: NPN,0.15A,50V; Part: 2SC2712; Category: Èý¼«¹Ü; QTY: 3000; other: NPN,0.15A,50V; Price: 0.24219; OPN_JLC: OPN_JLC; SN_JLC: SN_JLC; Price_JLC: 0
footprint SOT23-3 (SOT-23; 3 Leads; Body 3.0 x 2.5 mm, inc. leads (LxW max))
pins: 1 B, 2 E, 3 C

## Q_2SC4615E
designator Q?, comment 2SC4615E
Èý¼«¹Ü,NPN,1A,400V; Manufacturer: SANYO; pro-environment: RoHS; Quality: -55~125¡æ; SN: 03.4.22.11.99461501S; PadsNum: 0; Value: NPN,1A,400V; OPN: 2SC4615E; Part: 2SC4615E; Category: Èý¼«¹Ü; QTY: 3000; Price: ?; OPN_JLC: OPN_JLC; SN_JLC: SN_JLC; Price_JLC: 0
footprint SANYO_TP (SANYOÖ®NPNÈý¼«¹Ü£¬Èç2SC4615)
pins: 1 B, 2 E, 3 C

## Q_2SK2776
designator Q?, comment 2SK2776
MOS; NE; 8A; 500V; Manufacturer: Toshiba; pro-environment: RoHS; Quality: -55~150¡æ; SN: 03.4.24.21.31277601S; Value: NE,8A,500V; PadsNum: 0; OPN: 2SK2776; Part: 2SK2776; Category: MOS¹Ü; QTY: 1000; Price: ?; OPN_JLC: OPN_JLC; SN_JLC: SN_JLC; Price_JLC: 0
footprint TO220-3 (TO, Thru-Hole, Vertical, Heatsink Mounted; 3 In-Line Leads; Pitch 2.54 mm)
pins: 1 G, 2 D, 3 S
text: NE

## Q_ LS5912
designator Q?, comment LS5912
JFET; N; Manufacturer: Central Semiconductor; pro-environment: RoHS; Quality: -55~150¡æ; Value: JFET_N,15mA,35V; other: MARK=??; PadsNum: 0; SN: SN; OPN: LS5912; Part: LS5912; Category: JFET; QTY: 3000; Price: ?; OPN_JLC: OPN_JLC; SN_JLC: SN_JLC; Price_JLC: 0
footprint SOT23-6 (SOT23, 6-Leads, Body 2.9x1.6mm, Pitch 0.95mm, Lead Span 2.7mm, IPC Low Density)
part A pins: 1 G, 2 D, 3 S
part B pins: 4 G, 5 D, 6 S

## Q_BC807-40,215
designator Q?, comment BC807
Èý¼«¹Ü,PNP,0.5A,45V; Manufacturer: NXP; pro-environment: RoHS; Quality: -65~125¡æ; SN: 03.4.22.17.51BC0701S; OPN: BC807-40,215; PadsNum: 0; Value: PNP,0.5A,45V; Part: BC807; Category: Èý¼«¹Ü; QTY: 3000; Price: ?; OPN_JLC: SS8550; SN_JLC: C8542; Price_JLC: 0
footprint SOT23-3 (SOT-23; 3 Leads; Body 3.0 x 2.5 mm, inc. leads (LxW max))
pins: 1 B, 2 E, 3 C

## Q_BC817-40,215
designator Q?, comment BC817
Èý¼«¹Ü,NPN,0.5A,45V; Manufacturer: NXP; pro-environment: RoHS; Quality: -65~125¡æ; OPN: BC817-40,215; PadsNum: 0; SN: SN; Value: NPN,0.5A,45V; Part: BC817; Category: Èý¼«¹Ü; QTY: 3000; Price: ?; OPN_JLC: SS8050; SN_JLC: C2150; Price_JLC: 0
footprint SOT23-3 (SOT-23; 3 Leads; Body 3.0 x 2.5 mm, inc. leads (LxW max))
pins: 1 B, 2 E, 3 C

## Q_BC860CW,115
designator Q?, comment BC860C
BJT; NPN; 0.1A; 45V; Manufacturer: NXP; pro-environment: RoHS; Quality: -65~150¡æ; Value: NPN,0.1A,45V; OPN: BC860CW,115; other: MARK=4G*; PadsNum: 0; SN: SN; Part: BC860C; Category: Èý¼«¹Ü; QTY: 3000; Price: 0.23843; OPN_JLC: MMBT5551; SN_JLC: SN_JLC; Price_JLC: 0
footprint SOT23-3 (SOT-23; 3 Leads; Body 3.0 x 2.5 mm, inc. leads (LxW max))
pins: 1 B, 2 E, 3 C

## Q_BCP56T1G
designator Q?, comment BCP56
Èý¼«¹Ü,NPN,1A,80V; Manufacturer: ON; pro-environment: RoHS; Quality: -65~150¡æ; SN: 03.4.22.17.51CP5602S; OPN: BCP56T1G; other: MARK=BH; PadsNum: 0; Value: NPN,1A,80V; Part: BCP56; Category: Èý¼«¹Ü; QTY: 1000; Price: 0.77571; OPN_JLC: OPN_JLC; SN_JLC: SN_JLC; Price_JLC: 0
footprint SOT223-3 (SOT223, 4-Leads, Body 6.5x3.5mm, Pitch 2.3mm, Lead Span 7mm, IPC Low Density)
pins: 1 B, 2 C, 3 E, 4 C

## Q_BCX70K
designator Q?, comment BCX70K
Èý¼«¹Ü,NPN,0.2A,45V; Manufacturer: Fairchild; pro-environment: RoHS; Quality: -55~150¡æ; SN: 03.4.22.17.51CX7001S; other: MARK=AKs; PadsNum: 0; Value: NPN,0.2A,45V; OPN: BCX70K; Part: BCX70K; Category: Èý¼«¹Ü; QTY: 3000; Price: ?; OPN_JLC: MMBT5551; SN_JLC: C2145; Price_JLC: 0
footprint SOT23-3 (SOT-23; 3 Leads; Body 3.0 x 2.5 mm, inc. leads (LxW max))
pins: 1 B, 2 E, 3 C
